# Altium footprint library MyComponents_v2.5.PcbLib: 403 footprints (part 1 of 26)
Each footprint in its own frame and in the unit in brackets; x right, y up, seen from the top. Pads: shape width x height; smd on the part's side, far side on the other; paste and mask are expansions set on the pad; w line width, h text height; cw(c..) or ccw(c..) is an arc to the next point about the centre after c.
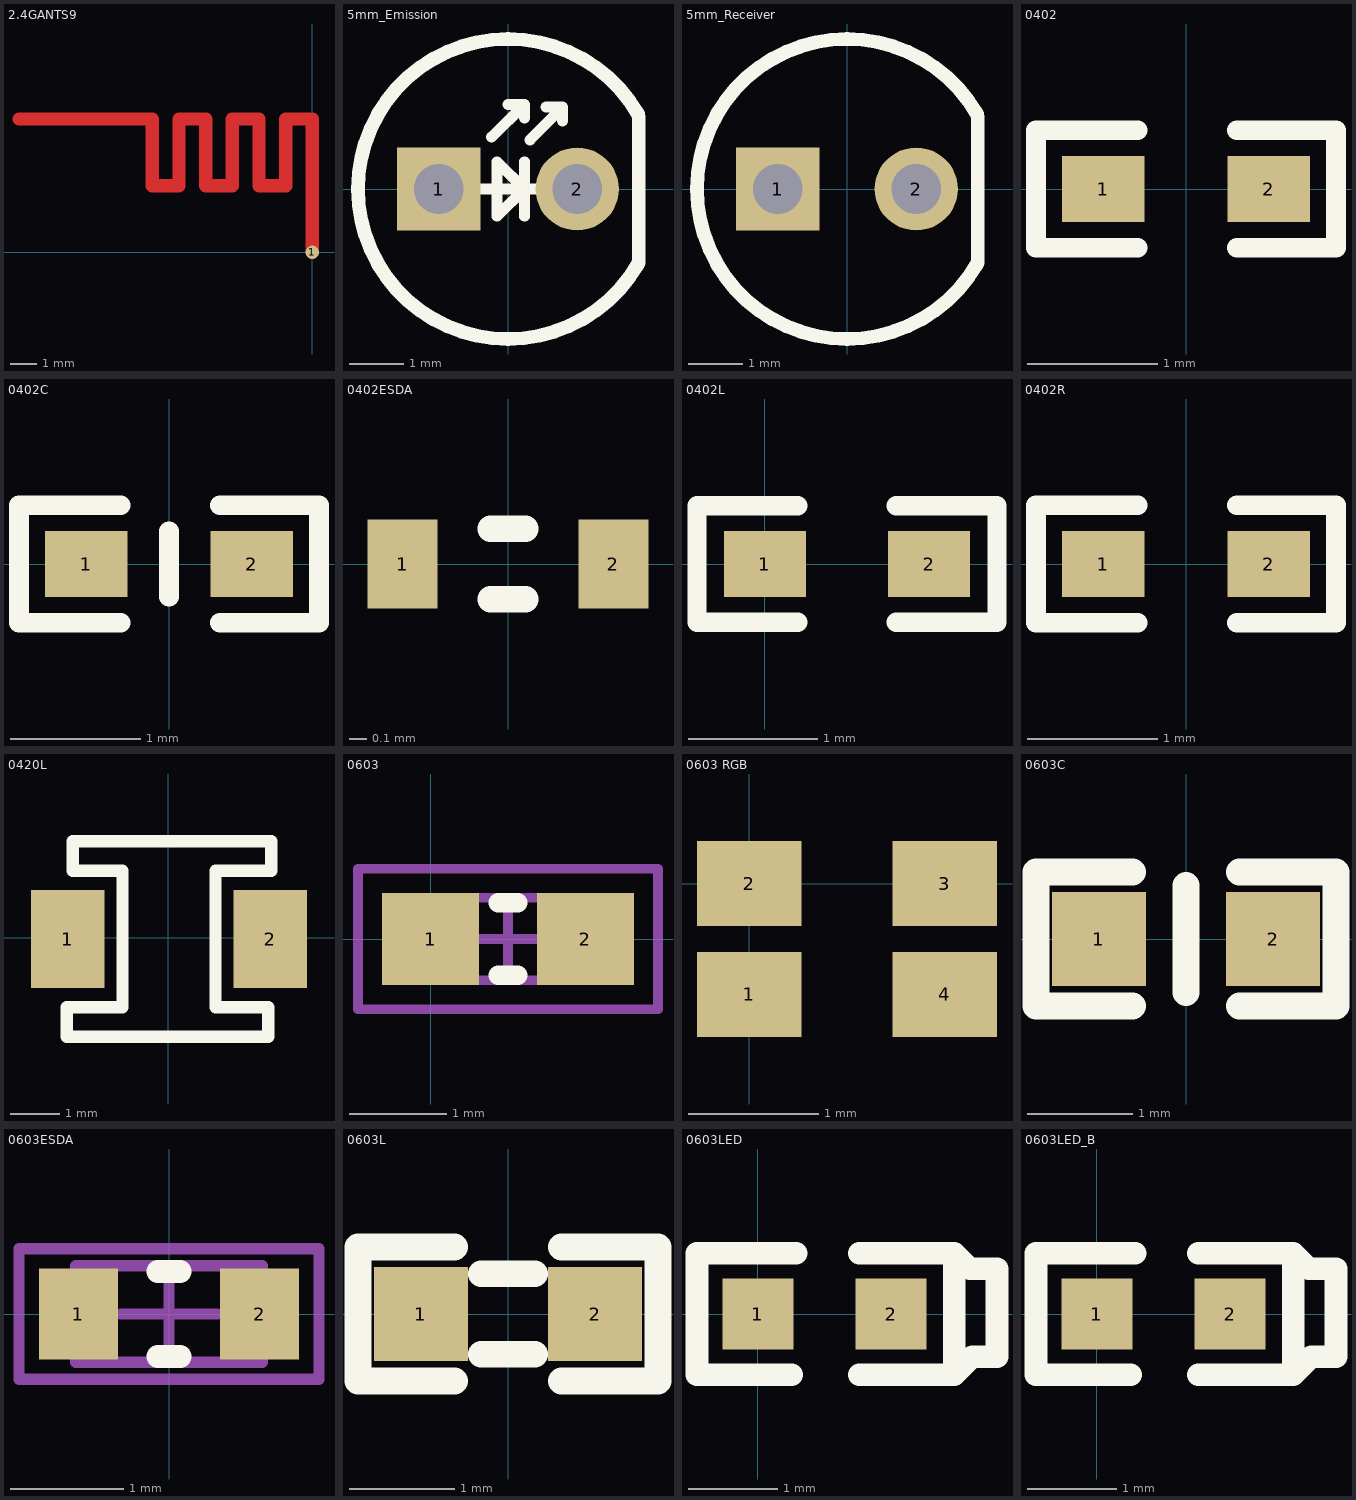
[diagram p0: the footprints below, top view; thin cyan lines are the x and y axes]

## 2.4GANTS9 [mm]
pads (1):
  round 0.5 smd: 1(0,0)
Top Layer:
  lines w0.5: -11,5 -6,5 -6,2.5 -5,2.5 -5,5 -4,5 ; -4,4.99 -4,2.5 -3,2.5 -3,5 -2,5 ; -2,4.96 -2,2.5 -1,2.5 -1,5 0,5 0,0

## 5mm_Emission [mil]
pads (2):
  rect 60x60 hole 36: 1(-50,0)
  round 60 hole 36: 2(50,0)
Top Overlay:
  lines w7.87: -19.68,0 27.56,0 ; -11.81,37.4 11.81,61.02 ; 0,61.02 11.81,61.02 ; 11.81,-19.68 11.81,11.81 11.81,19.68 ; 11.81,51.18 11.81,61.02 ; 15.75,35.43 39.37,59.06 ; 27.56,59.06 39.37,59.06 ; 39.37,49.21 39.37,59.06 ; -7.87,-19.68 -7.87,19.68 11.81,0 -7.87,-19.68
  lines w10: 93.76,-54.13 cw(c0,0) 93.76,54.13 ; 94.36,-53.15 94.36,52.17
3D body "IR_Emission 5MM.STEP": height 334.65, standoff -314.96, extent -114.17,-114.17 114.18,114.18

## 5mm_Receiver [mil]
pads (2):
  rect 60x60 hole 36: 1(-50,0)
  round 60 hole 36: 2(50,0)
Top Overlay:
  lines w10: 93.76,-54.13 cw(c0,0) 93.76,54.13 ; 94.36,-53.15 94.36,52.17
3D body "IR_Receiver 5MM.STEP": height 335.43, standoff -314.17, extent -114.17,-114.17 114.17,114.17

## 0402 [mil]
pads (2):
  rect 25x20 smd: 1(-25,0) 2(25,0)
Top Overlay:
  lines w5.91: -14.61,-17.72 -45.28,-17.72 -45.28,17.72 -14.61,17.72 ; 15.39,-17.72 45.28,-17.72 45.28,17.72 15.39,17.72
3D body "0402C.step": height 19.09, standoff -0.2, extent -19.68,-9.84 19.69,9.85

## 0402C [mil]
pads (2):
  rect 25x20 smd: 1(-25,0) 2(25,0)
Top Overlay:
  lines w5.91: -14.61,-17.72 -45.28,-17.72 -45.28,17.72 -14.61,17.72 ; 0,-9.84 0,9.85 ; 15.39,-17.72 45.28,-17.72 45.28,17.72 15.39,17.72
3D body "0402C.step": height 19.09, standoff -0.2, extent -19.68,-9.84 19.69,9.85

## 0402ESDA [mm]
pads (2):
  rect 0.4x0.508 smd: 1(-0.6,0) 2(0.6,0)
Top Overlay:
  lines w0.15: -0.1,-0.2 0.1,-0.2 ; -0.1,0.2 0.1,0.2
3D body "0402ESDA.stp": height 0.34, standoff -0.02, extent -0.5,-0.25 0.5,0.25

## 0402L [mil]
pads (2):
  rect 25x20 smd: 1(0,0) 2(50,0)
Top Overlay:
  lines w5.91: 10,-17.72 -20.67,-17.72 -20.67,17.72 10,17.72 ; 40,-17.72 70.67,-17.72 70.67,17.72 40,17.72
3D body "0402L.STEP": height 20.08, standoff 0.39, extent 5.31,-13 44.68,10.62

## 0402R [mil]
pads (2):
  rect 25x20 smd: 1(-25,0) 2(25,0)
Top Overlay:
  lines w5.91: -14.61,-17.72 -45.28,-17.72 -45.28,17.72 -14.61,17.72 ; 15.39,-17.72 45.28,-17.72 45.28,17.72 15.39,17.72
3D body "0402R.step": height 14.3, standoff 0, extent -19.5,-10 19.5,10

## 0420L [mm] "一体成型贴片电感"
height 2
pads (2):
  rect 1.5x2 smd: 1(-2.057,-0.025) 2(2.083,-0.025)
Top Overlay:
  lines w0.254: -2.083,-2.027 -2.083,-1.422 -0.94,-1.422 -0.94,1.372 -1.956,1.372 -1.956,1.977 2.108,1.977 2.108,1.372 0.965,1.372 0.965,-1.168 0.965,-1.422 2.041,-1.422 2.041,-2.027 -2.083,-2.027
3D body "XFL4020.STEP": height 2.05, standoff -0.05, extent -2.074,-2.175 2.226,2.125

## 0603 [mm] "Chip Resistor, 2-Leads, Body 1.6x0.8mm, IPC Medium Density"
height 0.5
pads (2):
  rect 1x0.95 smd: 1(0,0) 2(1.6,0)
Top Overlay:
  lines w0.2: 0.7,-0.375 0.9,-0.375 ; 0.7,0.375 0.9,0.375
Mechanical 13:
  lines w0.1: -0.025,-0.425 1.625,-0.425 1.625,0.425 -0.025,0.425 -0.025,-0.425
Mechanical 15:
  lines w0.1: 0.375,0 1.225,0 ; 0.8,-0.425 0.8,0.425 ; -0.75,-0.725 2.35,-0.725 2.35,0.725 -0.75,0.725 -0.75,-0.725
3D body: height 0.88, standoff 0, extent -0.025,-0.425 1.625,0.425

## 0603 RGB [mm]
pads (4):
  rect 0.8x0.65 smd: 1(0,-0.85) 2(0,0) 3(1.5,0) 4(1.5,-0.85)
3D body "0603 RGB LED.step": height 0.34, standoff -0.01, extent -0.1,-1.2 1.5,0.3

## 0603C [mil] "Chip Resistor, 2-Leads, Body 1.6x0.8mm, IPC Medium Density"
height 19.68
pads (2):
  rect 35x35 smd: 1(-32.5,0) 2(32.5,0)
Top Overlay:
  lines w10: -20,-25 -56,-25 -56,25 -20,25 ; 0,-20 0,20 ; 20,-25 56,-25 56,25 20,25
Mechanical 15:
  lines w2: 29.21,-1.42 39.21,-1.42 ; 34.21,-6.42 34.21,-1.42 34.21,3.58
3D body "c0603c689c5gac7867.stp": height 17.72, standoff 0, extent -31.5,-16 31.5,15.5

## 0603ESDA [mm] "Chip Resistor, 2-Leads, Body 1.6x0.8mm, IPC Medium Density"
height 0.5
pads (2):
  rect 0.7x0.8 smd: 1(-0.8,0) 2(0.8,0)
Top Overlay:
  lines w0.2: -0.1,-0.375 0.1,-0.375 ; -0.1,0.375 0.1,0.375
Mechanical 13:
  lines w0.1: -0.825,-0.425 0.825,-0.425 0.825,0.425 -0.825,0.425 -0.825,-0.425
Mechanical 15:
  lines w0.1: -0.425,0 0.425,0 ; 0,-0.425 0,0.425 ; -1.325,-0.575 1.325,-0.575 1.325,0.575 -1.325,0.575 -1.325,-0.575
3D body "0603ESDA.stp": height 0.45, standoff -0.01, extent -0.8,-0.4 0.8,0.4

## 0603L [mil] "Chip Resistor, 2-Leads, Body 1.6x0.8mm, IPC Medium Density"
height 19.68
pads (2):
  rect 35x35 smd: 1(-32.5,0) 2(32.5,0)
Top Overlay:
  lines w10: -20,-25 -56,-25 -56,25 -20,25 ; -10,-15 10,-15 ; -10,15 10,15 ; 20,-25 56,-25 56,25 20,25
Mechanical 15:
  lines w2: 29.21,-1.42 39.21,-1.42 ; 34.21,-6.42 34.21,-1.42 34.21,3.58
3D body "0603ESDA.stp": height 18.7, standoff 0.98, extent -31.49,-14.76 31.5,16.74

## 0603LED [mm]
pads (2):
  rect 0.8x0.8 smd: 1(0,0) 2(1.5,0)
Top Overlay:
  lines w0.254: 0.381,-0.686 -0.686,-0.686 -0.686,0.686 0.432,0.686 ; 1.143,-0.686 2.21,-0.686 ; 1.143,0.686 2.21,0.686 ; 2.21,-0.686 2.21,0.686 ; 2.21,-0.686 2.413,-0.483 2.692,-0.483 2.692,0.508 2.388,0.508 2.21,0.686

## 0603LED_B [mm]
pads (2):
  rect 0.8x0.8 smd: 1(0,0) 2(1.5,0)
Top Overlay:
  lines w0.254: 0.381,-0.686 -0.686,-0.686 -0.686,0.686 0.432,0.686 ; 1.143,-0.686 2.21,-0.686 ; 1.143,0.686 2.21,0.686 ; 2.21,-0.686 2.413,-0.483 2.692,-0.483 2.692,0.508 2.388,0.508 2.21,0.686 ; 2.21,-0.686 2.21,0.686
3D body "0603led_bue.STEP": height 0.6, standoff 0, extent -0.038,-0.4 1.562,0.4